# Altium footprint library Wireless_thermometer.PcbLib: 28 footprints (part 1 of 2)
Each footprint in its own frame and in the unit in brackets; x right, y up, seen from the top. Pads: shape width x height; smd on the part's side, far side on the other; paste and mask are expansions set on the pad; w line width, h text height; cw(c..) or ccw(c..) is an arc to the next point about the centre after c.
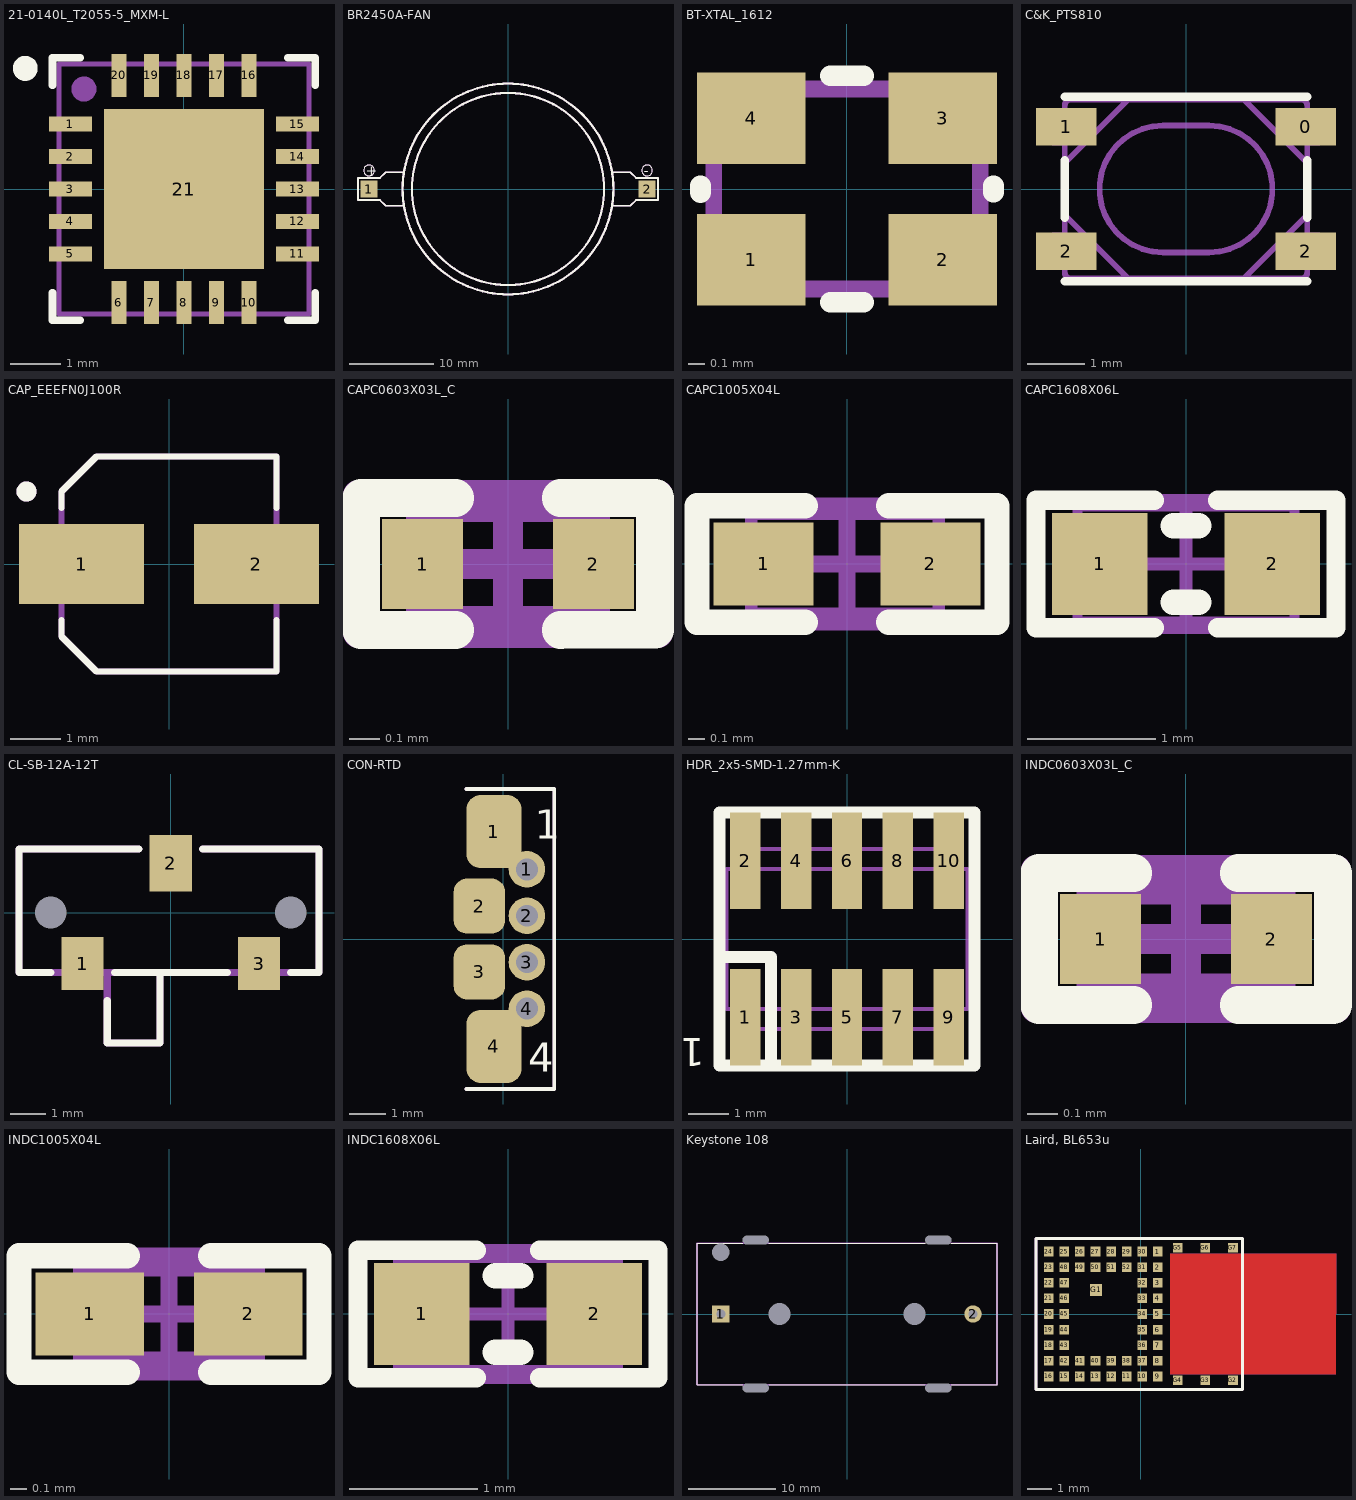
[diagram p0: the footprints below, top view; thin cyan lines are the x and y axes]

## 21-0140L_T2055-5_MXM-L [mm]
pads (21):
  rect 0.86x0.306 smd: 1(-2.272,1.3)
  rect 0.86x0.306 smd paste+0: 2(-2.272,0.65) 3(-2.272,0) 4(-2.272,-0.65) 5(-2.272,-1.3) 11(2.272,-1.3) 12(2.272,-0.65) 13(2.272,0) 14(2.272,0.65) 15(2.272,1.3)
  rect 0.306x0.86 smd paste+0: 6(-1.3,-2.272) 7(-0.65,-2.272) 8(0,-2.272) 9(0.65,-2.272) 10(1.3,-2.272) 16(1.3,2.272) 17(0.65,2.272) 18(0,2.272) 19(-0.65,2.272) 20(-1.3,2.272)
  rect 3.2x3.2 smd paste-1.664: 21(0,0)
Top Overlay:
  circle w0.25: c-3.175,2.413 r0.125
  lines w0.152: -2.629,-2.079 -2.629,-2.629 -2.079,-2.629 ; -2.629,2.079 -2.629,2.629 -2.079,2.629 ; 2.079,-2.629 2.629,-2.629 2.629,-2.079 ; 2.079,2.629 2.629,2.629 2.629,2.079
Top Paste:
  region: 1.576,-0.1 0.1,-0.1 0.1,-1.576 1.576,-1.576
  region: 1.576,1.576 0.1,1.576 0.1,0.1 1.576,0.1
  region: -0.1,-0.1 -1.576,-0.1 -1.576,-1.576 -0.1,-1.576
  region: -0.1,1.576 -1.576,1.576 -1.576,0.1 -0.1,0.1
Mechanical 7:
  circle w0.25: c-2,2 r0.125
  lines w0.1: -2.502,-2.502 -2.502,2.502 -1.251,2.502 -1.249,2.5 1.249,2.5 1.251,2.502 2.502,2.502 2.502,-2.502 -2.502,-2.502 ; -2.502,-1.478 -2.502,-1.122 -2.502,-1.478 ; -2.502,-0.828 -2.502,-0.472 -2.502,-0.828 ; -2.502,-0.178 -2.502,0.178 -2.502,-0.178 ; -2.502,0.472 -2.502,0.828 -2.502,0.472 ; -2.502,1.122 -2.502,1.478 -2.502,1.122 ; -1.478,-2.502 -1.122,-2.502 -1.478,-2.502 ; -1.478,2.502 -1.122,2.502 -1.478,2.502 ; -0.828,-2.502 -0.472,-2.502 -0.828,-2.502 ; -0.828,2.502 -0.472,2.502 -0.828,2.502 ; -0.178,-2.502 0.178,-2.502 -0.178,-2.502 ; -0.178,2.502 0.178,2.502 -0.178,2.502 ; 0.472,-2.502 0.828,-2.502 0.472,-2.502 ; 0.472,2.502 0.828,2.502 0.472,2.502 ; 1.122,-2.502 1.478,-2.502 1.122,-2.502 ; 1.122,2.502 1.478,2.502 1.122,2.502 ; 2.502,-1.478 2.502,-1.122 2.502,-1.478 ; 2.502,-0.828 2.502,-0.472 2.502,-0.828 ; 2.502,-0.178 2.502,0.178 2.502,-0.178 ; 2.502,0.472 2.502,0.828 2.502,0.472 ; 2.502,1.122 2.502,1.478 2.502,1.122
  text ".Designator" at -2.926,-0.207 h1.3
3D body "21-0140L_T2055-5_MXM.step": height 0.81, standoff 0, extent -2.502,-2.502 2.502,2.502

## BR2450A-FAN [mm]
pads (2):
  rect 2x2 smd: 1(-16.5,0) 2(16.5,0)
Top Overlay:
  circle w0.254: c0,0 r12.5
  circle w0.254: c0,0 r11.402
  circle w0.1: c-16.5,2.2 r0.64
  circle w0.1: c16.5,2.2 r0.64
  lines w0.2: -12.4,-2 -14.5,-2 -15.2,-1.3 -17.8,-1.3 -17.8,1.3 -17.7,1.3 -15.2,1.3 -14.5,2 -12.4,2 ; 12.4,-2 14.5,-2 15.2,-1.3 17.7,-1.3 17.8,-1.3 17.8,1.3 15.2,1.3 14.5,2 12.4,2
  text "+" at -16.9,1.6 h1.2
  text "-" at 16.1,1.6 h1.2
Mechanical 7:
  circle w0.1: c-16.5,2.2 r0.64
  circle w0.1: c16.5,2.2 r0.64
  circle w0.254: c0,0 r12.5
  circle w0.254: c0,0 r11.402
  lines w0.2: -12.4,-2 -14.5,-2 -15.2,-1.3 -17.8,-1.3 -17.8,1.3 -17.7,1.3 -15.2,1.3 -14.5,2 -12.4,2 ; 12.4,-2 14.5,-2 15.2,-1.3 17.7,-1.3 17.8,-1.3 17.8,1.3 15.2,1.3 14.5,2 12.4,2
  text "+" at -16.9,1.6 h1.2
  text "-" at 16.1,1.6 h1.2
  text ".Designator" at -6.758,-0.438 h3
3D body "BR2450A-FAN.stp": height 5.26, standoff 0.01, extent -17.79,-12.288 17.8,12.29

## BT-XTAL_1612 [mm]
pads (4):
  rect 0.65x0.55 smd: 1(-0.575,-0.425) 2(0.575,-0.425) 3(0.575,0.425) 4(-0.575,0.425)
Top Overlay:
  lines w0.125: -0.88,-0.02 -0.88,0.02 ; -0.1,-0.68 0.1,-0.68 ; -0.1,0.68 0.1,0.68 ; 0.88,-0.02 0.88,0.02
Mechanical 7:
  lines w0.1: -0.8,-0.6 0.8,-0.6 0.8,0.6 -0.8,0.6 -0.8,-0.6
  text ".Designator" at -0.6,-0.15 h0.38
3D body "User Library-Siward_AX1612.step": height 0.41, standoff 0, extent -0.83,-0.629 0.83,0.629
3D body: height 0.41, standoff 0.15, extent -0.7,-0.513 0.7,0.513

## C&K_PTS810 [mm]
pads (4):
  rect 1.05x0.65 smd: 0(2.075,1.075) 1(-2.075,1.075) 2(-2.075,-1.075) 2(2.075,-1.075)
Top Overlay:
  lines w0.15: -2.1,-1.6 2.1,-1.6 ; -2.1,-0.5 -2.1,0.5 ; -2.1,1.6 2.1,1.6 ; 2.1,-0.5 2.1,0.5
Mechanical 7:
  lines w0.1: -2.1,-1.35 -2.3,-1.35 -2.3,-0.8 -2.1,-0.8 ; -2.1,-0.45 -1,-1.55 ; -2.1,0.45 -1,1.55 ; -2.1,0.8 -2.3,0.8 -2.3,1.35 -2.1,1.35 ; 1,-1.55 2.1,-0.45 ; 1,1.55 2.1,0.45 ; 2.1,-1.35 2.3,-1.35 2.3,-0.8 2.1,-0.8 ; 2.1,0.8 2.3,0.8 2.3,1.35 2.1,1.35 ; -2.1,-1.45 ccw(c-2,-1.45) -2,-1.55 2,-1.55 ccw(c2,-1.45) 2.1,-1.45 2.1,1.45 ccw(c2,1.45) 2,1.55 -2,1.55 ccw(c-2,1.45) -2.1,1.45 -2.1,-1.45 ; -0.4,-1.1 cw(c-0.4,0) -0.4,1.1 0.4,1.1 cw(c0.4,0) 0.4,-1.1 -0.4,-1.1
  text ".Designator" at -2.699,-0.268 h1.2
3D body "Y97LT25BADBFP_-PTS810 SJ 250 SMTR.stp": height 2.5, standoff 0, extent -2.287,-1.6 2.288,1.6

## CAP_EEEFN0J100R [mm]
pads (2):
  rect 2.5x1.6 smd: 1(-1.75,0) 2(1.75,0)
Top Overlay:
  circle w0.2: c-2.85,1.45 r0.1
  lines w0.127: -2.15,-1.12 -2.15,-1.45 -1.45,-2.15 2.15,-2.15 2.15,-1.12 ; -2.15,1.12 -2.15,1.45 -1.45,2.15 2.15,2.15 2.15,1.12
Mechanical 7:
  circle w0.2: c-2.85,1.45 r0.1
  lines w0.127: -2.15,-1.12 -2.15,-1.45 -1.45,-2.15 2.15,-2.15 2.15,-1.12 ; -2.15,1.12 -2.15,1.45 -1.45,2.15 2.15,2.15 2.15,1.12
Mechanical 13:
  circle w0.2: c-2.85,1.45 r0.1
  lines w0.127: -2.15,-1.45 -2.15,1.45 -1.45,2.15 2.15,2.15 2.15,-2.15 -1.45,-2.15 -2.15,-1.45
3D body "step_temp.STEP": height 5.81, standoff 0.01, extent -2.5,-2.15 2.5,2.15

## CAPC0603X03L_C [mm]
pads (2):
  rect 0.27x0.3 smd: 1(-0.285,0) 2(0.285,0)
Top Overlay:
  lines w0.125: -0.175,-0.22 -0.49,-0.22 -0.49,0.22 -0.175,0.22 ; 0.175,-0.22 0.49,-0.22 0.49,0.22 0.175,0.22
Mechanical 7:
  lines w0.05: -0.315,-0.165 -0.315,0.165 0.315,0.165 0.315,-0.165 -0.315,-0.165
  text ".Designator" at -1.5,0.399 h0.3
Mechanical 15:
  lines w0.1: -0.165,0 0.165,0 ; 0,-0.165 0,0.165 ; -0.5,-0.23 -0.5,0.23 0.5,0.23 0.5,-0.23 -0.5,-0.23
3D body "User Library-0201(0603M) Cap.step": height 0.3, standoff -0.01, extent -0.305,-0.152 0.305,0.153

## CAPC1005X04L [mm]
pads (2):
  rect 0.6x0.5 smd: 1(-0.5,0) 2(0.5,0)
Top Overlay:
  lines w0.152: -0.25,-0.35 -0.9,-0.35 -0.9,0.35 -0.25,0.35 ; 0.25,-0.35 0.9,-0.35 0.9,0.35 0.25,0.35
Mechanical 7:
  lines w0.075: -0.575,-0.3 -0.575,0.3 0.55,0.3 0.55,-0.3 -0.575,-0.3
  text ".Designator" at -1.126,-0.145 h0.5
Mechanical 15:
  lines w0.1: -0.275,0 0.275,0 ; 0,-0.275 0,0.275 ; -0.9,-0.35 -0.9,0.35 0.9,0.35 0.9,-0.35 -0.9,-0.35
3D body "User Library-0402(1005M) Cap.step": height 0.5, standoff -0.01, extent -0.508,-0.254 0.508,0.254

## CAPC1608X06L [mm]
pads (2):
  rect 0.75x0.8 smd: 1(-0.675,0) 2(0.675,0)
Top Overlay:
  lines w0.152: -0.25,-0.5 -1.175,-0.5 -1.175,0.5 -0.25,0.5 ; 0.25,-0.5 1.175,-0.5 1.175,0.5 0.25,0.5
  lines w0.2: -0.1,-0.3 0.1,-0.3 ; -0.1,0.3 0.1,0.3
Mechanical 7:
  lines w0.075: -0.85,-0.45 0.85,-0.45 0.85,0.45 -0.85,0.45 -0.85,-0.45
  text ".Designator" at -1.573,-0.197 h0.7
Mechanical 15:
  lines w0.1: -0.45,0 0.45,0 ; 0,-0.45 0,0.45 ; -1.175,-0.5 -1.175,0.5 1.175,0.5 1.175,-0.5 -1.175,-0.5
3D body "User Library-Chip Capacitor 0603.step": height 0.8, standoff 0, extent -0.8,-0.43 0.8,0.43

## CL-SB-12A-12T [mm]
pads (5):
  round 0 hole 0.9 unplated: 0(-3.4,0) 0(3.4,0)
  rect 1.2x1.5 smd: 1(-2.5,-1.45) 3(2.5,-1.45)
  rect 1.2x1.6 smd: 2(0,1.4)
Top Overlay:
  lines w0.2: -3.4,-1.7 -4.3,-1.7 -4.3,1.8 -0.9,1.8 ; -1.8,-2.5 -1.8,-3.7 -0.3,-3.7 -0.3,-1.7 ; -1.6,-1.7 1.6,-1.7 ; 0.9,1.8 4.2,1.8 4.2,-1.7 3.4,-1.7
Mechanical 7:
  lines w0.2: -3.4,-1.7 -4.3,-1.7 ; -1.8,-1.7 -1.8,-3.7 -0.3,-3.7 -0.3,-1.7 ; -0.9,1.8 -4.3,1.8 -4.3,-1.7 ; 0.9,1.8 4.2,1.8 4.2,-1.7 3.4,-1.7 -4.3,-1.7
  text ".Designator" at -2.253,-0.166 h1
3D body "CL-SB-12A-12T.stp": height 3.51, standoff -0.79, extent -4.25,-3.75 4.25,1.75

## CON-RTD [mm]
pads (8):
  rrect50% 1.5x2 smd: 1(-0.25,2.935) 4(-0.25,-2.935)
  round 1 hole 0.6: 1(0.65,1.905) 2(0.65,0.635) 3(0.65,-0.635) 4(0.65,-1.905)
  rrect50% 1.4x1.5 smd: 2(-0.65,0.9) 3(-0.65,-0.9)
Top Overlay:
  lines w0.1: -1,-4.1 1.4,-4.1 1.4,4.089 ; -1,4.1 1.4,4.1
  text "1" at 0.867,2.735 h0.8
  text "4" at 0.683,-3.625 h0.8
Mechanical 7:
  lines w0.1: -1,-4.1 1.4,-4.1 1.4,4.089 ; -1,4.1 1.4,4.1
  text "4" at 0.683,-3.625 h0.8
  text "1" at 0.867,2.735 h0.8
  text ".Designator" at -1.025,3.309 h1

## HDR_2x5-SMD-1.27mm-K [mm]
pads (10):
  rect 0.76x2.4 smd: 1(-2.54,-1.95) 2(-2.54,1.95) 3(-1.27,-1.95) 4(-1.27,1.95) 5(0,-1.95) 6(0,1.95) 7(1.27,-1.95) 8(1.27,1.95) 9(2.54,-1.95) 10(2.54,1.95)
Top Overlay:
  lines w0.3: -3.175,-0.45 -1.9,-0.45 -1.9,-3.15 ; -3.175,-3.15 3.175,-3.15 3.175,3.15 -3.175,3.15 -3.175,-3.15
  text "1" at -3.55,-2.475 h0.7
Mechanical 7:
  lines w0.1: -2.74,-1.75 -2.74,-2.459 ccw(c-2.54,-2.459) -2.34,-2.459 -2.34,-2.25 ; -2.74,1.75 -2.74,2.459 cw(c-2.54,2.459) -2.34,2.459 -2.34,2.25 ; -2.5,-1.75 -2.5,-2.25 -1.25,-2.25 ; -2.5,1.75 -2.5,2.25 2.5,2.25 2.5,1.75 ; -1.47,-2.25 -1.47,-2.459 ccw(c-1.27,-2.459) -1.07,-2.459 -1.07,-2.25 ; -1.47,2.25 -1.47,2.459 cw(c-1.27,2.459) -1.07,2.459 -1.07,2.25 ; -1.25,-1.75 -1.25,-2.25 ; -0.2,-2.25 -0.2,-2.459 ccw(c0,-2.459) 0.2,-2.459 0.2,-2.25 ; -0.2,2.25 -0.2,2.459 cw(c0,2.459) 0.2,2.459 0.2,2.25 ; 1.07,-2.25 1.07,-2.459 ccw(c1.27,-2.459) 1.47,-2.459 1.47,-2.25 ; 1.07,2.25 1.07,2.459 cw(c1.27,2.459) 1.47,2.459 1.47,2.25 ; 1.25,-1.75 1.25,-2.25 ; 2.34,-2.25 2.34,-2.459 ccw(c2.54,-2.459) 2.74,-2.459 2.74,-1.75 ; 2.34,2.25 2.34,2.459 cw(c2.54,2.459) 2.74,2.459 2.74,1.75 ; 2.5,-1.75 2.5,-2.25 1.25,-2.25 ; -1.25,-2.25 1.25,-2.25 ; -3,-1.75 3,-1.75 3,1.75 -3,1.75 -3,-1.75 ; -2.75,-1.335 -2.75,-0.935 -2.35,-0.935 -2.35,-1.335 -2.75,-1.335 ; -2.73,0.935 -2.33,0.935 -2.33,1.335 -2.73,1.335 -2.73,0.935 ; -1.48,-1.335 -1.08,-1.335 -1.08,-0.935 -1.48,-0.935 -1.48,-1.335 ; -1.46,0.935 -1.46,1.335 -1.06,1.335 -1.06,0.935 -1.46,0.935 ; -0.21,-1.335 0.19,-1.335 0.19,-0.935 -0.21,-0.935 -0.21,-1.335 ; -0.19,0.935 0.21,0.935 0.21,1.335 -0.19,1.335 -0.19,0.935 ; 1.06,-1.335 1.46,-1.335 1.46,-0.935 1.06,-0.935 1.06,-1.335 ; 1.08,0.935 1.48,0.935 1.48,1.335 1.08,1.335 1.08,0.935 ; 2.33,-1.335 2.73,-1.335 2.73,-0.935 2.33,-0.935 2.33,-1.335 ; 2.35,0.935 2.35,1.335 2.75,1.335 2.75,0.935 2.35,0.935
  text "1" at -3.025,-2.05 h0.7
  text ".Designator" at -2.253,-0.266 h1
3D body "Samtec-FTSH-105-01-F-DV-K.step": height 6.11, standoff -0.01, extent -3.137,-2.921 3.137,2.921

## INDC0603X03L_C [mm]
pads (2):
  rect 0.27x0.3 smd: 1(-0.285,0) 2(0.285,0)
Top Overlay:
  lines w0.125: -0.175,-0.22 -0.49,-0.22 -0.49,0.22 -0.175,0.22 ; 0.175,-0.22 0.49,-0.22 0.49,0.22 0.175,0.22
Mechanical 7:
  lines w0.1: -0.315,-0.165 0.315,-0.165 0.315,0.165 -0.315,0.165 -0.315,-0.165
  text ".Designator" at -0.306,0.268 h0.3
Mechanical 15:
  lines w0.1: -0.165,0 0.165,0 ; 0,-0.165 0,0.165 ; -0.5,-0.23 0.5,-0.23 0.5,0.23 -0.5,0.23 -0.5,-0.23
3D body "User Library-smt_inductor-0201.step": height 0.26, standoff -0.01, extent -0.31,-0.16 0.31,0.16

## INDC1005X04L [mm] "Chip Inductor, 2-Leads, Body 1.0x0.5mm, IPC High Density"
height 0.4
pads (2):
  rect 0.65x0.5 smd: 1(-0.475,0) 2(0.475,0)
Top Overlay:
  lines w0.152: -0.25,-0.35 -0.9,-0.35 -0.9,0.35 -0.25,0.35 ; 0.25,-0.35 0.9,-0.35 0.9,0.35 0.25,0.35
Mechanical 7:
  lines w0.1: -0.525,-0.275 -0.525,0.275 0.525,0.275 0.525,-0.275 -0.525,-0.275
  text ".Designator" at -0.432,-0.152 h0.3
Mechanical 15:
  lines w0.1: -0.275,0 0.275,0 ; 0,-0.275 0,0.275 ; -0.9,-0.35 -0.9,0.35 0.9,0.35 0.9,-0.35 -0.9,-0.35
3D body "User Library-Chip Inductor 0402.step": height 0.5, standoff 0, extent -0.5,-0.3 0.5,0.3

## INDC1608X06L [mm] "Chip Inductor, 2-Leads, Body 1.6x0.8mm, IPC High Density"
height 0.55
pads (2):
  rect 0.75x0.8 smd: 1(-0.675,0) 2(0.675,0)
Top Overlay:
  lines w0.152: -0.25,-0.5 -1.175,-0.5 -1.175,0.5 -0.25,0.5 ; 0.25,-0.5 1.175,-0.5 1.175,0.5 0.25,0.5
  lines w0.2: -0.1,-0.3 0.1,-0.3 ; -0.1,0.3 0.1,0.3
Mechanical 7:
  lines w0.1: -0.85,-0.45 -0.85,0.45 0.85,0.45 0.85,-0.45 -0.85,-0.45
  text ".Designator" at -0.711,-0.152 h0.3
Mechanical 15:
  lines w0.1: -0.45,0 0.45,0 ; 0,-0.45 0,0.45 ; -1.175,-0.5 1.175,-0.5 1.175,0.5 -1.175,0.5 -1.175,-0.5
3D body "User Library-Chip Inductor.step": height 0.8, standoff 0, extent -0.8,-0.475 0.8,0.475

## Keystone 108 [mm]
pads (9):
  rect 2x2 hole 1: 1(-14.5,0)
  round 2 hole 1: 2(14.5,0)
  round 0 hole 2 unplated: 3(-14.5,7.1)
  rrect50% 0x0 hole 1 slot 3 at 0 deg unplated: 3(-10.5,-8.5)
  rrect0% 0x0 hole 1 slot 3 at 0 deg unplated: 3(-10.5,8.5) 3(10.5,-8.5) 3(10.5,8.5)
  round 0 hole 2.5 unplated: 3(-7.75,0) 3(7.75,0)
Top Overlay:
  lines w0.1: -12,-8.15 -17.25,-8.15 -17.25,8.15 -12,8.15 ; -9,-8.15 9,-8.15 ; -9,8.15 9,8.15 ; 12,-8.15 17.25,-8.15 17.25,8.15 12,8.15
Mechanical 7:
  lines w0.2: -9,-8.15 12.45,-8.15 ; -9,8.2 12.575,8.15 ; -8.35,8.15 -17.25,8.15 -17.25,-8.15 -7.075,-8.15 ; 12,-8.15 17.25,-8.15 17.25,8.15 12,8.15
  text ".Designator" at 4.506,0.581 h2
3D body "keystone-PN108.STEP": height 15.25, standoff -3.04, extent -17.167,-8.066 17.123,8.19

## Laird, BL653u [mm]
pads (59):
  rect 0.4x0.4 smd mask+0.051: 1(0.712,2.6) 2(0.712,1.95) 3(0.712,1.3) 4(0.712,0.65) 5(0.712,0) 6(0.712,-0.65) 7(0.712,-1.3) 8(0.712,-1.95) 9(0.712,-2.6) 10(0.062,-2.6) 11(-0.587,-2.6) 12(-1.237,-2.6) 13(-1.887,-2.6) 14(-2.537,-2.6) 15(-3.187,-2.6) 16(-3.837,-2.6) 17(-3.837,-1.95) 18(-3.837,-1.3) 19(-3.837,-0.65) 20(-3.837,0) 21(-3.837,0.65) 22(-3.837,1.3) 23(-3.837,1.95) 24(-3.837,2.6) 25(-3.187,2.6) 26(-2.537,2.6) 27(-1.887,2.6) 28(-1.237,2.6) 29(-0.588,2.6) 30(0.063,2.6) 31(0.062,1.95) 32(0.062,1.3) 33(0.062,0.65) 34(0.062,0) 35(0.062,-0.65) 36(0.062,-1.3) 37(0.063,-1.95) 38(-0.588,-1.95) 39(-1.237,-1.95) 40(-1.887,-1.95) 41(-2.537,-1.95) 42(-3.187,-1.95) 43(-3.187,-1.3) 44(-3.187,-0.65) 45(-3.187,0) 46(-3.187,0.65) 47(-3.187,1.3) 48(-3.187,1.95) 49(-2.537,1.95) 50(-1.887,1.95) 51(-1.237,1.95) 52(-0.587,1.95) G2(3.837,-2.75) G3(2.687,-2.75) G4(1.537,-2.75) G5(1.538,2.75) G6(2.687,2.75) G7(3.837,2.75)
  rect 0.5x0.5 smd mask+0.051: G1(-1.862,1)
Top Layer:
  pour cut-out: 1.225,2.5 8.125,2.5 8.125,-2.5 1.225,-2.5
GND:
  pour cut-out: 1.225,2.5 8.125,2.5 8.125,-2.5 1.225,-2.5
VCC:
  pour cut-out: 1.225,2.5 8.125,2.5 8.125,-2.5 1.225,-2.5
Bottom Layer:
  pour cut-out: 1.225,2.5 8.125,2.5 8.125,-2.5 1.225,-2.5
Top Overlay:
  lines w0.127: -4.363,-3.15 4.238,-3.15 4.238,3.15 -4.363,3.15 -4.363,-3.15
Mechanical 7:
  lines w0.127: -4.363,-3.15 4.238,-3.15 4.238,3.15 -4.363,3.15 -4.363,-3.15
  text ".Designator" at 0.059,2.253 h1
3D body "BL653Š 453-00059_3D Model.STEP": height 1.61, standoff 0, extent -4.35,-3.15 4.25,3.15